# Altium footprint library Mech.PcbLib: 75 footprints (part 2 of 5)
Each footprint in its own frame and in the unit in brackets; x right, y up, seen from the top. Pads: shape width x height; smd on the part's side, far side on the other; paste and mask are expansions set on the pad; w line width, h text height; cw(c..) or ccw(c..) is an arc to the next point about the centre after c.
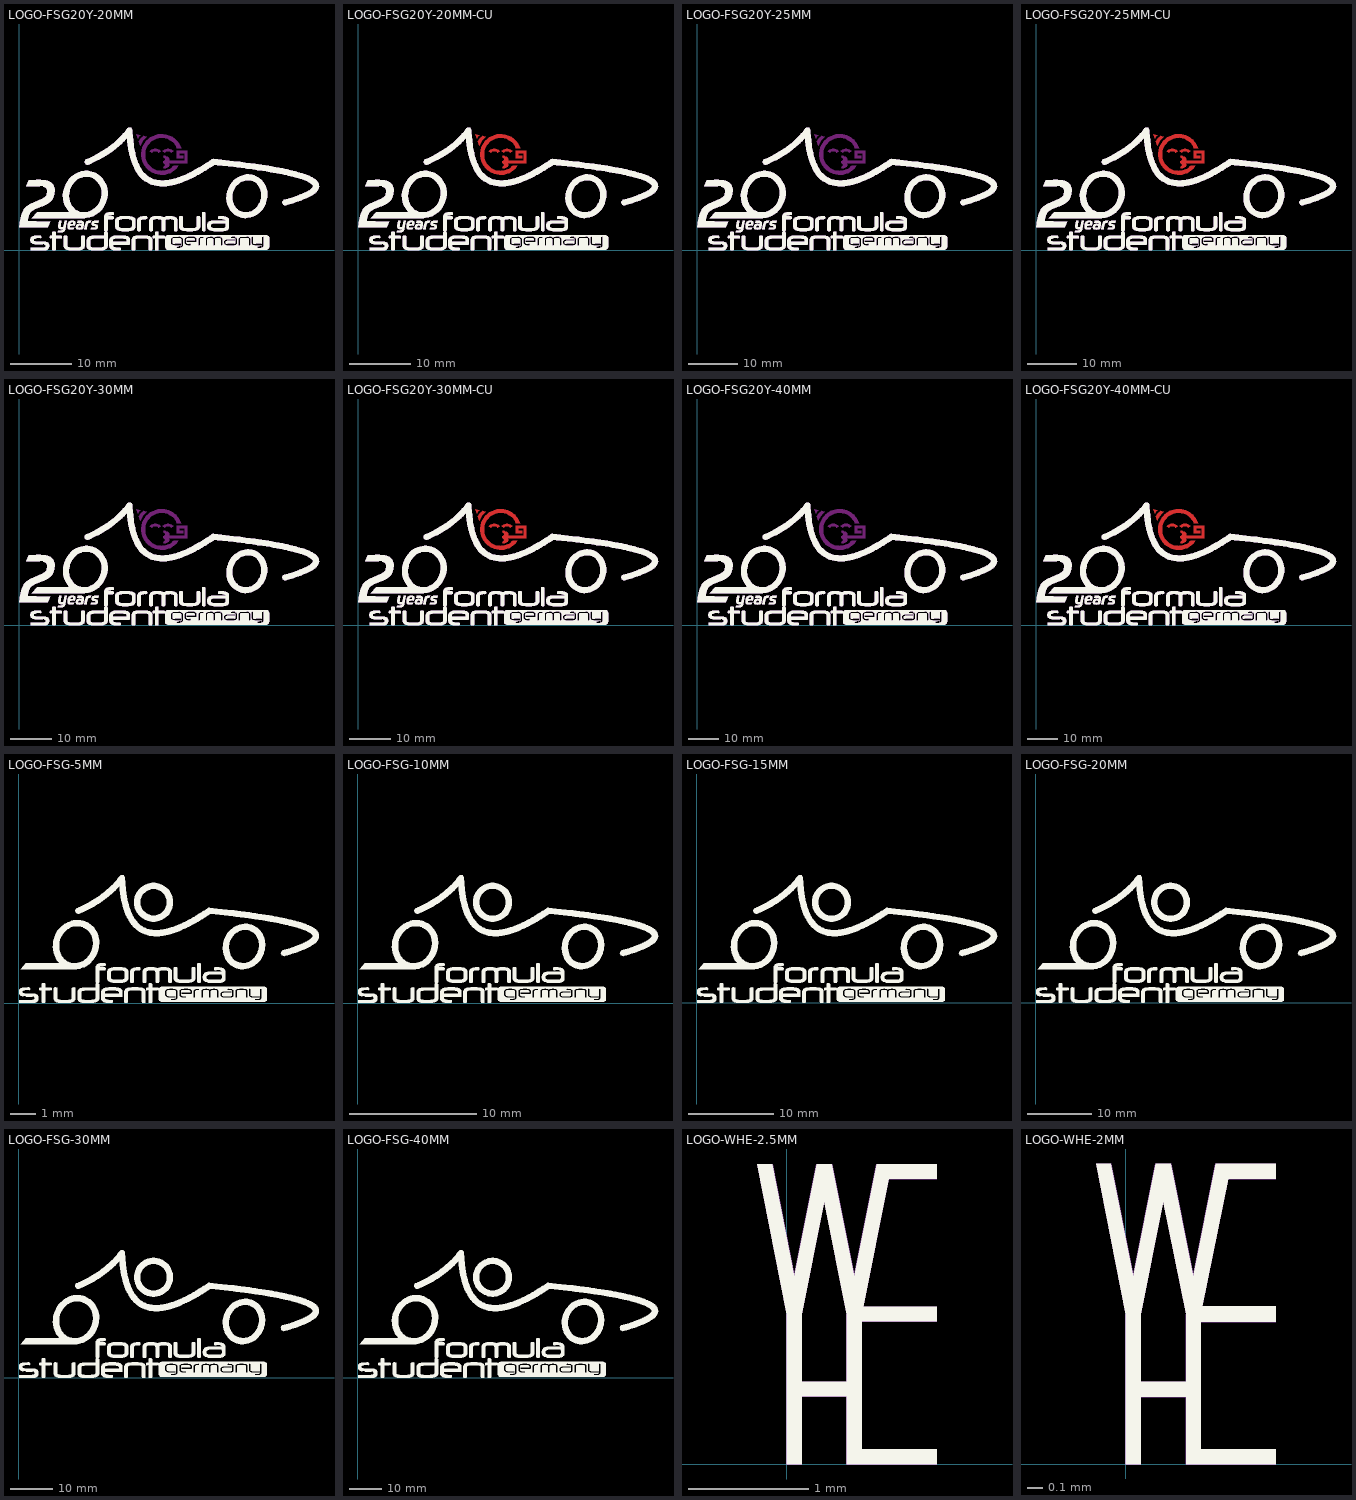
[diagram p1: the footprints below, top view; thin cyan lines are the x and y axes]

## LOGO-FSG20Y-20MM [mm] "Source: https://www.formulastudent.de/pr/logos /  / Terms of use / Nutzungsbedingungen /  / \"Formula Student\" is registered trademark. The FSG logos are also subject to international copyright laws.  /  / EN: The right to use the FSG logo in an appropriate context is reserved to the teams, to the sponsors of the FSG event and to the press reporting on FSG. Other parties including the teams' sponsors are not allowed to use the FSG logo for any purpose. /  / DE: Teams, Sponsoren des FSG-Wettbewerb und Presse, die über die FSG berichtet, dürfen das FSG-Logo im entsprechenden Kontext frei verwenden. Anderen, die Sponsoren der Teams eingeschlossen, ist die Verwendung des FSG-Logos nicht gestattet."
Top Layer keep-out:
  region: 412 vertices and 0 holes, not listed, extent 23.472,13.335 27.364,16.243
  region: 23.36,16.11 23.691,15.86 23.694,15.86 23.746,15.922 23.871,16.026 24.016,16.099 24.173,16.136 24.335,16.136 24.493,16.099 24.638,16.026 24.762,15.922 24.814,15.86 25.145,16.11 25.068,16.214 24.868,16.381 24.636,16.498 24.383,16.557 24.123,16.557 23.87,16.498 23.637,16.381 23.438,16.214
  region: 21.285,16.11 21.616,15.86 21.619,15.86 21.671,15.922 21.796,16.026 21.94,16.099 22.098,16.136 22.26,16.136 22.418,16.099 22.563,16.026 22.687,15.922 22.739,15.86 23.07,16.11 22.992,16.214 22.793,16.381 22.561,16.498 22.308,16.557 22.048,16.557 21.795,16.498 21.562,16.381 21.363,16.214
  region: 20.518,15.616 20.523,15.44 20.569,15.09 20.661,14.748 20.796,14.422 20.972,14.116 21.187,13.836 21.437,13.586 21.717,13.372 22.023,13.195 22.349,13.06 22.69,12.969 23.04,12.923 23.217,12.917 23.214,12.923 23.35,12.926 23.62,12.953 23.887,13.008 24.146,13.089 24.396,13.195 24.634,13.326 24.858,13.481 25.065,13.657 25.162,13.753 25.962,13.753 25.848,13.585 25.582,13.281 25.28,13.011 24.949,12.78 24.591,12.59 24.213,12.446 23.821,12.348 23.419,12.299 23.217,12.299 22.999,12.299 22.568,12.356 22.147,12.468 21.745,12.635 21.368,12.852 21.023,13.117 20.715,13.425 20.45,13.77 20.233,14.147 20.066,14.549 19.953,14.97 19.897,15.401 19.897,15.619 19.897,15.837 19.953,16.268 20.066,16.688 20.233,17.091 20.45,17.467 20.715,17.813 21.023,18.12 21.368,18.385 21.745,18.603 22.147,18.77 22.568,18.882 22.999,18.939 23.217,18.939 23.477,18.939 23.992,18.857 24.489,18.697 24.954,18.461 25.376,18.155 25.746,17.787 26.054,17.366 26.292,16.903 26.374,16.655 25.71,16.655 25.627,16.835 25.422,17.175 25.17,17.481 24.876,17.747 24.546,17.967 24.187,18.136 23.807,18.25 23.415,18.308 23.217,18.315 23.04,18.309 22.69,18.263 22.349,18.172 22.023,18.037 21.717,17.86 21.437,17.645 21.188,17.396 20.973,17.116 20.796,16.81 20.661,16.484 20.57,16.143 20.523,15.793
  region: 19.766,17.065 19.517,17.729 19.588,17.854 19.746,18.092 19.92,18.32 20.109,18.535 20.211,18.635 20.805,18.478 20.641,18.33 20.339,18.006 20.077,17.65 19.859,17.266
  region: 19.064,18.942 19.755,18.757 19.699,18.694 19.589,18.563 19.484,18.429 19.383,18.291 19.335,18.22
Top Overlay:
  drawing of 25 lines, arcs and shapes, not listed
Top Solder:
  drawing of 6 lines, arcs and shapes, not listed
Top Assembly:
  drawing of 25 lines, arcs and shapes, not listed

## LOGO-FSG20Y-20MM-CU [mm] "Source: https://www.formulastudent.de/pr/logos /  / Terms of use / Nutzungsbedingungen /  / \"Formula Student\" is registered trademark. The FSG logos are also subject to international copyright laws.  /  / EN: The right to use the FSG logo in an appropriate context is reserved to the teams, to the sponsors of the FSG event and to the press reporting on FSG. Other parties including the teams' sponsors are not allowed to use the FSG logo for any purpose. /  / DE: Teams, Sponsoren des FSG-Wettbewerb und Presse, die über die FSG berichtet, dürfen das FSG-Logo im entsprechenden Kontext frei verwenden. Anderen, die Sponsoren der Teams eingeschlossen, ist die Verwendung des FSG-Logos nicht gestattet."
Top Layer:
  region: 412 vertices and 0 holes, not listed, extent 23.472,13.335 27.364,16.243
  region: 23.36,16.11 23.691,15.86 23.694,15.86 23.746,15.922 23.871,16.026 24.016,16.099 24.173,16.136 24.335,16.136 24.493,16.099 24.638,16.026 24.762,15.922 24.814,15.86 25.145,16.11 25.068,16.214 24.868,16.381 24.636,16.498 24.383,16.557 24.123,16.557 23.87,16.498 23.637,16.381 23.438,16.214
  region: 21.285,16.11 21.616,15.86 21.619,15.86 21.671,15.922 21.796,16.026 21.94,16.099 22.098,16.136 22.26,16.136 22.418,16.099 22.563,16.026 22.687,15.922 22.739,15.86 23.07,16.11 22.992,16.214 22.793,16.381 22.561,16.498 22.308,16.557 22.048,16.557 21.795,16.498 21.562,16.381 21.363,16.214
  region: 20.518,15.616 20.523,15.44 20.569,15.09 20.661,14.748 20.796,14.422 20.972,14.116 21.187,13.836 21.437,13.586 21.717,13.372 22.023,13.195 22.349,13.06 22.69,12.969 23.04,12.923 23.217,12.917 23.214,12.923 23.35,12.926 23.62,12.953 23.887,13.008 24.146,13.089 24.396,13.195 24.634,13.326 24.858,13.481 25.065,13.657 25.162,13.753 25.962,13.753 25.848,13.585 25.582,13.281 25.28,13.011 24.949,12.78 24.591,12.59 24.213,12.446 23.821,12.348 23.419,12.299 23.217,12.299 22.999,12.299 22.568,12.356 22.147,12.468 21.745,12.635 21.368,12.852 21.023,13.117 20.715,13.425 20.45,13.77 20.233,14.147 20.066,14.549 19.953,14.97 19.897,15.401 19.897,15.619 19.897,15.837 19.953,16.268 20.066,16.688 20.233,17.091 20.45,17.467 20.715,17.813 21.023,18.12 21.368,18.385 21.745,18.603 22.147,18.77 22.568,18.882 22.999,18.939 23.217,18.939 23.477,18.939 23.992,18.857 24.489,18.697 24.954,18.461 25.376,18.155 25.746,17.787 26.054,17.366 26.292,16.903 26.374,16.655 25.71,16.655 25.627,16.835 25.422,17.175 25.17,17.481 24.876,17.747 24.546,17.967 24.187,18.136 23.807,18.25 23.415,18.308 23.217,18.315 23.04,18.309 22.69,18.263 22.349,18.172 22.023,18.037 21.717,17.86 21.437,17.645 21.188,17.396 20.973,17.116 20.796,16.81 20.661,16.484 20.57,16.143 20.523,15.793
  region: 19.766,17.065 19.517,17.729 19.588,17.854 19.746,18.092 19.92,18.32 20.109,18.535 20.211,18.635 20.805,18.478 20.641,18.33 20.339,18.006 20.077,17.65 19.859,17.266
  region: 19.064,18.942 19.755,18.757 19.699,18.694 19.589,18.563 19.484,18.429 19.383,18.291 19.335,18.22
Top Overlay:
  drawing of 25 lines, arcs and shapes, not listed
Top Solder:
  drawing of 6 lines, arcs and shapes, not listed
Top Assembly:
  drawing of 25 lines, arcs and shapes, not listed

## LOGO-FSG20Y-25MM [mm] "Source: https://www.formulastudent.de/pr/logos /  / Terms of use / Nutzungsbedingungen /  / \"Formula Student\" is registered trademark. The FSG logos are also subject to international copyright laws.  /  / EN: The right to use the FSG logo in an appropriate context is reserved to the teams, to the sponsors of the FSG event and to the press reporting on FSG. Other parties including the teams' sponsors are not allowed to use the FSG logo for any purpose. /  / DE: Teams, Sponsoren des FSG-Wettbewerb und Presse, die über die FSG berichtet, dürfen das FSG-Logo im entsprechenden Kontext frei verwenden. Anderen, die Sponsoren der Teams eingeschlossen, ist die Verwendung des FSG-Logos nicht gestattet."
Top Layer keep-out:
  region: 23.828,23.679 24.692,23.449 24.621,23.369 24.484,23.206 24.353,23.038 24.227,22.866 24.167,22.778
  region: 24.706,21.333 24.394,22.164 24.483,22.32 24.68,22.618 24.898,22.902 25.135,23.17 25.262,23.296 26.004,23.1 25.799,22.915 25.422,22.51 25.095,22.065 24.821,21.585
  region: 25.645,19.523 25.652,19.302 25.71,18.865 25.824,18.438 25.992,18.03 26.213,17.648 26.482,17.298 26.794,16.986 27.144,16.717 27.526,16.497 27.934,16.328 28.36,16.214 28.798,16.156 29.019,16.149 29.015,16.156 29.185,16.16 29.523,16.195 29.856,16.262 30.18,16.364 30.493,16.497 30.79,16.661 31.07,16.854 31.329,17.074 31.449,17.194 32.45,17.194 32.308,16.985 31.975,16.604 31.598,16.267 31.183,15.977 30.736,15.741 30.264,15.56 29.773,15.438 29.271,15.376 29.019,15.376 28.747,15.376 28.207,15.447 27.682,15.588 27.179,15.796 26.708,16.068 26.276,16.399 25.892,16.784 25.561,17.216 25.289,17.687 25.08,18.189 24.94,18.715 24.869,19.254 24.869,19.526 24.869,19.798 24.94,20.338 25.08,20.863 25.289,21.366 25.561,21.837 25.892,22.268 26.276,22.653 26.708,22.984 27.179,23.256 27.682,23.464 28.207,23.605 28.747,23.676 29.019,23.676 29.236,23.676 29.667,23.631 30.092,23.54 30.505,23.407 30.901,23.231 31.278,23.014 31.629,22.76 31.953,22.47 32.244,22.148 32.5,21.798 32.719,21.423 32.897,21.027 32.965,20.821 32.134,20.821 32.031,21.047 31.775,21.471 31.46,21.854 31.092,22.186 30.679,22.461 30.231,22.672 29.757,22.815 29.266,22.887 29.019,22.896 28.798,22.889 28.36,22.831 27.934,22.717 27.527,22.548 27.144,22.328 26.794,22.059 26.482,21.747 26.214,21.397 25.993,21.015 25.824,20.607 25.71,20.181 25.652,19.743
  region: 26.605,20.14 27.018,19.828 27.022,19.828 27.087,19.906 27.242,20.036 27.423,20.126 27.62,20.173 27.823,20.173 28.02,20.126 28.201,20.036 28.356,19.906 28.422,19.828 28.835,20.14 28.738,20.27 28.489,20.479 28.199,20.624 27.882,20.699 27.558,20.699 27.241,20.624 26.951,20.479 26.702,20.27
  region: 29.198,20.14 29.612,19.828 29.615,19.828 29.681,19.906 29.836,20.036 30.017,20.126 30.214,20.173 30.417,20.173 30.614,20.126 30.795,20.036 30.95,19.906 31.015,19.828 31.429,20.14 31.332,20.27 31.083,20.479 30.792,20.624 30.476,20.699 30.151,20.699 29.835,20.624 29.545,20.479 29.295,20.27
  region: 414 vertices and 0 holes, not listed, extent 29.337,16.671 34.202,20.306
Top Overlay:
  drawing of 25 lines, arcs and shapes, not listed
Top Solder:
  drawing of 6 lines, arcs and shapes, not listed
Top Assembly:
  drawing of 25 lines, arcs and shapes, not listed

## LOGO-FSG20Y-25MM-CU [mm] "Source: https://www.formulastudent.de/pr/logos /  / Terms of use / Nutzungsbedingungen /  / \"Formula Student\" is registered trademark. The FSG logos are also subject to international copyright laws.  /  / EN: The right to use the FSG logo in an appropriate context is reserved to the teams, to the sponsors of the FSG event and to the press reporting on FSG. Other parties including the teams' sponsors are not allowed to use the FSG logo for any purpose. /  / DE: Teams, Sponsoren des FSG-Wettbewerb und Presse, die über die FSG berichtet, dürfen das FSG-Logo im entsprechenden Kontext frei verwenden. Anderen, die Sponsoren der Teams eingeschlossen, ist die Verwendung des FSG-Logos nicht gestattet."
Top Layer:
  region: 414 vertices and 0 holes, not listed, extent 29.337,16.671 34.202,20.306
  region: 29.198,20.14 29.612,19.828 29.615,19.828 29.681,19.906 29.836,20.036 30.017,20.126 30.214,20.173 30.417,20.173 30.614,20.126 30.795,20.036 30.95,19.906 31.015,19.828 31.429,20.14 31.332,20.27 31.083,20.479 30.792,20.624 30.476,20.699 30.151,20.699 29.835,20.624 29.545,20.479 29.295,20.27
  region: 26.605,20.14 27.018,19.828 27.022,19.828 27.087,19.906 27.242,20.036 27.423,20.126 27.62,20.173 27.823,20.173 28.02,20.126 28.201,20.036 28.356,19.906 28.422,19.828 28.835,20.14 28.738,20.27 28.489,20.479 28.199,20.624 27.882,20.699 27.558,20.699 27.241,20.624 26.951,20.479 26.702,20.27
  region: 25.645,19.523 25.652,19.302 25.71,18.865 25.824,18.438 25.992,18.03 26.213,17.648 26.482,17.298 26.794,16.986 27.144,16.717 27.526,16.497 27.934,16.328 28.36,16.214 28.798,16.156 29.019,16.149 29.015,16.156 29.185,16.16 29.523,16.195 29.856,16.262 30.18,16.364 30.493,16.497 30.79,16.661 31.07,16.854 31.329,17.074 31.449,17.194 32.45,17.194 32.308,16.985 31.975,16.604 31.598,16.267 31.183,15.977 30.736,15.741 30.264,15.56 29.773,15.438 29.271,15.376 29.019,15.376 28.747,15.376 28.207,15.447 27.682,15.588 27.179,15.796 26.708,16.068 26.276,16.399 25.892,16.784 25.561,17.216 25.289,17.687 25.08,18.189 24.94,18.715 24.869,19.254 24.869,19.526 24.869,19.798 24.94,20.338 25.08,20.863 25.289,21.366 25.561,21.837 25.892,22.268 26.276,22.653 26.708,22.984 27.179,23.256 27.682,23.464 28.207,23.605 28.747,23.676 29.019,23.676 29.236,23.676 29.667,23.631 30.092,23.54 30.505,23.407 30.901,23.231 31.278,23.014 31.629,22.76 31.953,22.47 32.244,22.148 32.5,21.798 32.719,21.423 32.897,21.027 32.965,20.821 32.134,20.821 32.031,21.047 31.775,21.471 31.46,21.854 31.092,22.186 30.679,22.461 30.231,22.672 29.757,22.815 29.266,22.887 29.019,22.896 28.798,22.889 28.36,22.831 27.934,22.717 27.527,22.548 27.144,22.328 26.794,22.059 26.482,21.747 26.214,21.397 25.993,21.015 25.824,20.607 25.71,20.181 25.652,19.743
  region: 24.706,21.333 24.394,22.164 24.483,22.32 24.68,22.618 24.898,22.902 25.135,23.17 25.262,23.296 26.004,23.1 25.799,22.915 25.422,22.51 25.095,22.065 24.821,21.585
  region: 23.828,23.679 24.692,23.449 24.621,23.369 24.484,23.206 24.353,23.038 24.227,22.866 24.167,22.778
Top Overlay:
  drawing of 25 lines, arcs and shapes, not listed
Top Solder:
  drawing of 6 lines, arcs and shapes, not listed
Top Assembly:
  drawing of 25 lines, arcs and shapes, not listed

## LOGO-FSG20Y-30MM [mm] "Source: https://www.formulastudent.de/pr/logos /  / Terms of use / Nutzungsbedingungen /  / \"Formula Student\" is registered trademark. The FSG logos are also subject to international copyright laws.  /  / EN: The right to use the FSG logo in an appropriate context is reserved to the teams, to the sponsors of the FSG event and to the press reporting on FSG. Other parties including the teams' sponsors are not allowed to use the FSG logo for any purpose. /  / DE: Teams, Sponsoren des FSG-Wettbewerb und Presse, die über die FSG berichtet, dürfen das FSG-Logo im entsprechenden Kontext frei verwenden. Anderen, die Sponsoren der Teams eingeschlossen, ist die Verwendung des FSG-Logos nicht gestattet."
Top Layer keep-out:
  region: 28.59,28.415 29.627,28.139 29.542,28.043 29.377,27.847 29.22,27.646 29.069,27.439 28.997,27.333
  region: 29.644,25.6 29.269,26.597 29.376,26.784 29.613,27.141 29.874,27.482 30.158,27.805 30.311,27.956 31.202,27.72 30.955,27.498 30.503,27.013 30.11,26.478 29.782,25.902
  region: 30.77,23.428 30.779,23.163 30.848,22.638 30.985,22.127 31.187,21.637 31.452,21.179 31.774,20.758 32.149,20.384 32.569,20.062 33.027,19.797 33.517,19.594 34.028,19.458 34.553,19.389 34.818,19.38 34.814,19.388 35.018,19.393 35.423,19.434 35.823,19.516 36.212,19.637 36.587,19.797 36.944,19.994 37.28,20.225 37.59,20.49 37.735,20.633 38.935,20.633 38.764,20.382 38.365,19.926 37.913,19.521 37.415,19.174 36.879,18.89 36.312,18.673 35.724,18.527 35.121,18.453 34.818,18.453 34.492,18.453 33.845,18.538 33.214,18.707 32.611,18.957 32.046,19.283 31.528,19.68 31.066,20.142 30.669,20.66 30.343,21.225 30.093,21.828 29.924,22.459 29.839,23.106 29.839,23.432 29.839,23.758 29.924,24.405 30.093,25.036 30.343,25.639 30.669,26.204 31.066,26.722 31.528,27.184 32.046,27.581 32.611,27.907 33.214,28.157 33.845,28.326 34.492,28.411 34.818,28.411 35.078,28.411 35.596,28.357 36.106,28.248 36.601,28.088 37.077,27.877 37.529,27.617 37.951,27.312 38.339,26.964 38.688,26.578 38.996,26.158 39.258,25.708 39.472,25.233 39.553,24.986 38.557,24.986 38.432,25.256 38.125,25.766 37.747,26.225 37.306,26.623 36.811,26.953 36.273,27.206 35.704,27.378 35.115,27.465 34.818,27.476 34.553,27.467 34.028,27.398 33.517,27.261 33.028,27.058 32.569,26.793 32.149,26.471 31.775,26.097 31.453,25.677 31.188,25.218 30.985,24.729 30.848,24.218 30.779,23.693
  region: 31.922,24.168 32.418,23.794 32.422,23.794 32.5,23.887 32.687,24.043 32.904,24.152 33.141,24.208 33.384,24.208 33.62,24.152 33.837,24.043 34.024,23.887 34.102,23.794 34.598,24.168 34.482,24.325 34.183,24.575 33.834,24.75 33.455,24.84 33.065,24.84 32.686,24.75 32.337,24.575 32.038,24.325
  region: 35.034,24.168 35.53,23.794 35.534,23.794 35.612,23.887 35.799,24.043 36.016,24.152 36.253,24.208 36.496,24.208 36.732,24.152 36.949,24.043 37.136,23.887 37.214,23.794 37.71,24.168 37.594,24.325 37.295,24.575 36.946,24.75 36.567,24.84 36.177,24.84 35.798,24.75 35.449,24.575 35.15,24.325
  region: 411 vertices and 0 holes, not listed, extent 35.2,20.007 41.038,24.368
Top Overlay:
  drawing of 25 lines, arcs and shapes, not listed
Top Solder:
  drawing of 6 lines, arcs and shapes, not listed
Top Assembly:
  drawing of 25 lines, arcs and shapes, not listed

## LOGO-FSG20Y-30MM-CU [mm] "Source: https://www.formulastudent.de/pr/logos /  / Terms of use / Nutzungsbedingungen /  / \"Formula Student\" is registered trademark. The FSG logos are also subject to international copyright laws.  /  / EN: The right to use the FSG logo in an appropriate context is reserved to the teams, to the sponsors of the FSG event and to the press reporting on FSG. Other parties including the teams' sponsors are not allowed to use the FSG logo for any purpose. /  / DE: Teams, Sponsoren des FSG-Wettbewerb und Presse, die über die FSG berichtet, dürfen das FSG-Logo im entsprechenden Kontext frei verwenden. Anderen, die Sponsoren der Teams eingeschlossen, ist die Verwendung des FSG-Logos nicht gestattet."
Top Layer:
  region: 411 vertices and 0 holes, not listed, extent 35.2,20.007 41.038,24.368
  region: 35.034,24.168 35.53,23.794 35.534,23.794 35.612,23.887 35.799,24.043 36.016,24.152 36.253,24.208 36.496,24.208 36.732,24.152 36.949,24.043 37.136,23.887 37.214,23.794 37.71,24.168 37.594,24.325 37.295,24.575 36.946,24.75 36.567,24.84 36.177,24.84 35.798,24.75 35.449,24.575 35.15,24.325
  region: 31.922,24.168 32.418,23.794 32.422,23.794 32.5,23.887 32.687,24.043 32.904,24.152 33.141,24.208 33.384,24.208 33.62,24.152 33.837,24.043 34.024,23.887 34.102,23.794 34.598,24.168 34.482,24.325 34.183,24.575 33.834,24.75 33.455,24.84 33.065,24.84 32.686,24.75 32.337,24.575 32.038,24.325
  region: 30.77,23.428 30.779,23.163 30.848,22.638 30.985,22.127 31.187,21.637 31.452,21.179 31.774,20.758 32.149,20.384 32.569,20.062 33.027,19.797 33.517,19.594 34.028,19.458 34.553,19.389 34.818,19.38 34.814,19.388 35.018,19.393 35.423,19.434 35.823,19.516 36.212,19.637 36.587,19.797 36.944,19.994 37.28,20.225 37.59,20.49 37.735,20.633 38.935,20.633 38.764,20.382 38.365,19.926 37.913,19.521 37.415,19.174 36.879,18.89 36.312,18.673 35.724,18.527 35.121,18.453 34.818,18.453 34.492,18.453 33.845,18.538 33.214,18.707 32.611,18.957 32.046,19.283 31.528,19.68 31.066,20.142 30.669,20.66 30.343,21.225 30.093,21.828 29.924,22.459 29.839,23.106 29.839,23.432 29.839,23.758 29.924,24.405 30.093,25.036 30.343,25.639 30.669,26.204 31.066,26.722 31.528,27.184 32.046,27.581 32.611,27.907 33.214,28.157 33.845,28.326 34.492,28.411 34.818,28.411 35.078,28.411 35.596,28.357 36.106,28.248 36.601,28.088 37.077,27.877 37.529,27.617 37.951,27.312 38.339,26.964 38.688,26.578 38.996,26.158 39.258,25.708 39.472,25.233 39.553,24.986 38.557,24.986 38.432,25.256 38.125,25.766 37.747,26.225 37.306,26.623 36.811,26.953 36.273,27.206 35.704,27.378 35.115,27.465 34.818,27.476 34.553,27.467 34.028,27.398 33.517,27.261 33.028,27.058 32.569,26.793 32.149,26.471 31.775,26.097 31.453,25.677 31.188,25.218 30.985,24.729 30.848,24.218 30.779,23.693
  region: 29.644,25.6 29.269,26.597 29.376,26.784 29.613,27.141 29.874,27.482 30.158,27.805 30.311,27.956 31.202,27.72 30.955,27.498 30.503,27.013 30.11,26.478 29.782,25.902
  region: 28.59,28.415 29.627,28.139 29.542,28.043 29.377,27.847 29.22,27.646 29.069,27.439 28.997,27.333
Top Overlay:
  drawing of 25 lines, arcs and shapes, not listed
Top Solder:
  drawing of 6 lines, arcs and shapes, not listed
Top Assembly:
  drawing of 25 lines, arcs and shapes, not listed

## LOGO-FSG20Y-40MM [mm] "Source: https://www.formulastudent.de/pr/logos /  / Terms of use / Nutzungsbedingungen /  / \"Formula Student\" is registered trademark. The FSG logos are also subject to international copyright laws.  /  / EN: The right to use the FSG logo in an appropriate context is reserved to the teams, to the sponsors of the FSG event and to the press reporting on FSG. Other parties including the teams' sponsors are not allowed to use the FSG logo for any purpose. /  / DE: Teams, Sponsoren des FSG-Wettbewerb und Presse, die über die FSG berichtet, dürfen das FSG-Logo im entsprechenden Kontext frei verwenden. Anderen, die Sponsoren der Teams eingeschlossen, ist die Verwendung des FSG-Logos nicht gestattet."
Top Layer keep-out:
  region: 408 vertices and 0 holes, not listed, extent 46.929,26.679 54.712,32.493
  region: 46.707,32.227 47.369,31.728 47.374,31.728 47.479,31.852 47.727,32.06 48.017,32.205 48.332,32.28 48.656,32.28 48.971,32.205 49.261,32.06 49.51,31.852 49.614,31.728 50.276,32.227 50.172,32.365 49.925,32.607 49.644,32.808 49.335,32.963 49.006,33.068 48.664,33.122 48.319,33.122 47.977,33.068 47.648,32.963 47.339,32.808 47.058,32.607 46.811,32.365
  region: 42.558,32.227 43.22,31.728 43.225,31.728 43.33,31.852 43.578,32.06 43.868,32.205 44.183,32.28 44.507,32.28 44.823,32.205 45.112,32.06 45.361,31.852 45.465,31.728 46.127,32.227 46.023,32.365 45.776,32.607 45.495,32.808 45.186,32.963 44.857,33.068 44.515,33.122 44.17,33.122 43.828,33.068 43.499,32.963 43.19,32.808 42.909,32.607 42.662,32.365
  region: 41.023,31.24 41.035,30.887 41.126,30.187 41.309,29.505 41.579,28.852 41.932,28.241 42.361,27.681 42.861,27.182 43.421,26.752 44.032,26.399 44.685,26.129 45.367,25.947 46.067,25.855 46.42,25.843 46.414,25.854 46.686,25.861 47.227,25.916 47.759,26.024 48.278,26.186 48.778,26.399 49.254,26.661 49.701,26.97 50.115,27.323 50.308,27.514 51.908,27.514 51.681,27.179 51.148,26.57 50.546,26.031 49.882,25.568 49.167,25.19 48.412,24.901 47.627,24.705 46.824,24.607 46.42,24.607 46.094,24.607 45.444,24.671 44.805,24.798 44.181,24.987 43.578,25.237 43.003,25.544 42.46,25.907 41.956,26.321 41.495,26.782 41.081,27.286 40.719,27.828 40.411,28.404 40.162,29.006 39.973,29.63 39.845,30.27 39.781,30.919 39.781,31.245 39.781,31.571 39.845,32.22 39.973,32.86 40.162,33.484 40.411,34.087 40.719,34.662 41.081,35.204 41.495,35.709 41.956,36.17 42.46,36.584 43.003,36.946 43.578,37.253 44.181,37.503 44.805,37.692 45.444,37.82 46.094,37.884 46.42,37.884 46.767,37.883 47.457,37.811 48.137,37.667 48.797,37.453 49.432,37.171 50.033,36.825 50.596,36.418 51.113,35.955 51.579,35.44 51.989,34.88 52.339,34.28 52.624,33.647 52.733,33.317 51.404,33.317 51.296,33.559 51.046,34.024 50.751,34.463 50.415,34.872 50.04,35.245 49.631,35.58 49.191,35.873 48.724,36.121 48.235,36.323 47.729,36.476 47.21,36.579 46.684,36.63 46.42,36.636 46.067,36.625 45.367,36.532 44.685,36.35 44.033,36.08 43.422,35.727 42.862,35.297 42.363,34.798 41.933,34.238 41.58,33.627 41.31,32.974 41.127,32.293 41.035,31.593
  region: 39.521,34.136 39.022,35.465 39.164,35.714 39.48,36.191 39.828,36.645 40.207,37.075 40.41,37.276 41.598,36.962 41.432,36.816 41.112,36.511 40.81,36.187 40.528,35.847 40.266,35.49 40.025,35.119 39.806,34.735 39.61,34.338
  region: 38.116,37.889 39.499,37.52 39.386,37.393 39.166,37.132 38.956,36.863 38.755,36.587 38.659,36.446
Top Overlay:
  drawing of 25 lines, arcs and shapes, not listed
Top Solder:
  drawing of 6 lines, arcs and shapes, not listed
Top Assembly:
  drawing of 25 lines, arcs and shapes, not listed

## LOGO-FSG20Y-40MM-CU [mm]
Top Layer:
  region: 38.116,37.889 39.499,37.52 39.386,37.393 39.166,37.132 38.956,36.863 38.755,36.587 38.659,36.446
  region: 39.521,34.136 39.022,35.465 39.164,35.714 39.48,36.191 39.828,36.645 40.207,37.075 40.41,37.276 41.598,36.962 41.432,36.816 41.112,36.511 40.81,36.187 40.528,35.847 40.266,35.49 40.025,35.119 39.806,34.735 39.61,34.338
  region: 41.023,31.24 41.035,30.887 41.126,30.187 41.309,29.505 41.579,28.852 41.932,28.241 42.361,27.681 42.861,27.182 43.421,26.752 44.032,26.399 44.685,26.129 45.367,25.947 46.067,25.855 46.42,25.843 46.414,25.854 46.686,25.861 47.227,25.916 47.759,26.024 48.278,26.186 48.778,26.399 49.254,26.661 49.701,26.97 50.115,27.323 50.308,27.514 51.908,27.514 51.681,27.179 51.148,26.57 50.546,26.031 49.882,25.568 49.167,25.19 48.412,24.901 47.627,24.705 46.824,24.607 46.42,24.607 46.094,24.607 45.444,24.671 44.805,24.798 44.181,24.987 43.578,25.237 43.003,25.544 42.46,25.907 41.956,26.321 41.495,26.782 41.081,27.286 40.719,27.828 40.411,28.404 40.162,29.006 39.973,29.63 39.845,30.27 39.781,30.919 39.781,31.245 39.781,31.571 39.845,32.22 39.973,32.86 40.162,33.484 40.411,34.087 40.719,34.662 41.081,35.204 41.495,35.709 41.956,36.17 42.46,36.584 43.003,36.946 43.578,37.253 44.181,37.503 44.805,37.692 45.444,37.82 46.094,37.884 46.42,37.884 46.767,37.883 47.457,37.811 48.137,37.667 48.797,37.453 49.432,37.171 50.033,36.825 50.596,36.418 51.113,35.955 51.579,35.44 51.989,34.88 52.339,34.28 52.624,33.647 52.733,33.317 51.404,33.317 51.296,33.559 51.046,34.024 50.751,34.463 50.415,34.872 50.04,35.245 49.631,35.58 49.191,35.873 48.724,36.121 48.235,36.323 47.729,36.476 47.21,36.579 46.684,36.63 46.42,36.636 46.067,36.625 45.367,36.532 44.685,36.35 44.033,36.08 43.422,35.727 42.862,35.297 42.363,34.798 41.933,34.238 41.58,33.627 41.31,32.974 41.127,32.293 41.035,31.593
  region: 42.558,32.227 43.22,31.728 43.225,31.728 43.33,31.852 43.578,32.06 43.868,32.205 44.183,32.28 44.507,32.28 44.823,32.205 45.112,32.06 45.361,31.852 45.465,31.728 46.127,32.227 46.023,32.365 45.776,32.607 45.495,32.808 45.186,32.963 44.857,33.068 44.515,33.122 44.17,33.122 43.828,33.068 43.499,32.963 43.19,32.808 42.909,32.607 42.662,32.365
  region: 46.707,32.227 47.369,31.728 47.374,31.728 47.479,31.852 47.727,32.06 48.017,32.205 48.332,32.28 48.656,32.28 48.971,32.205 49.261,32.06 49.51,31.852 49.614,31.728 50.276,32.227 50.172,32.365 49.925,32.607 49.644,32.808 49.335,32.963 49.006,33.068 48.664,33.122 48.319,33.122 47.977,33.068 47.648,32.963 47.339,32.808 47.058,32.607 46.811,32.365
  region: 408 vertices and 0 holes, not listed, extent 46.929,26.679 54.712,32.493
Top Overlay:
  drawing of 25 lines, arcs and shapes, not listed
Top Solder:
  drawing of 6 lines, arcs and shapes, not listed
Top Assembly:
  drawing of 25 lines, arcs and shapes, not listed

## LOGO-FSG-5MM [mm] "Source: https://www.formulastudent.de/pr/logos /  / Terms of use / Nutzungsbedingungen /  / \"Formula Student\" is registered trademark. The FSG logos are also subject to international copyright laws.  /  / EN: The right to use the FSG logo in an appropriate context is reserved to the teams, to the sponsors of the FSG event and to the press reporting on FSG. Other parties including the teams' sponsors are not allowed to use the FSG logo for any purpose. /  / DE: Teams, Sponsoren des FSG-Wettbewerb und Presse, die über die FSG berichtet, dürfen das FSG-Logo im entsprechenden Kontext frei verwenden. Anderen, die Sponsoren der Teams eingeschlossen, ist die Verwendung des FSG-Logos nicht gestattet."
Top Overlay:
  drawing of 20 lines, arcs and shapes, not listed
3D body: height 0.05, standoff 0, extent 0.006,0.008 0.765,0.609
3D body: height 0.05, standoff 0, extent 0.797,0.008 1.284,0.771
3D body: height 0.05, standoff 0, extent 0.069,1.322 2.201,1.552
3D body: height 0.05, standoff 0, extent 1.366,0.006 2.205,0.609
3D body: height 0.05, standoff 0, extent 1.331,1.321 3.142,3.241
3D body: height 0.05, standoff 0, extent 2.292,0.008 3.134,0.769
3D body: height 0.05, standoff 0, extent 3.003,0.795 3.385,1.558
3D body: height 0.05, standoff 0, extent 3.212,0.008 4.041,0.609
3D body: height 0.05, standoff 0, extent 3.447,0.795 4.266,1.394
3D body: height 0.05, standoff 0, extent 4.122,0.008 4.94,0.609
3D body: height 0.05, standoff 0, extent 4.346,0.795 4.737,1.394
3D body: height 0.05, standoff 0, extent 4.97,0.008 5.459,0.771
3D body: height 0.05, standoff 0, extent 4.504,3.181 6.013,4.69
3D body: height 0.05, standoff 0, extent 4.837,0.795 5.971,1.394
3D body: height 0.05, standoff 0, extent 6.051,0.794 6.89,1.394
3D body: height 0.05, standoff 0, extent 2.205,1.836 11.716,4.997
3D body: height 0.05, standoff 0, extent 6.971,0.795 7.103,1.558
3D body: height 0.05, standoff 0, extent 5.466,0.047 9.685,0.632
3D body: height 0.05, standoff 0, extent 7.188,0.795 8.063,1.394
3D body: height 0.05, standoff 0, extent 7.962,1.323 9.615,3.095

## LOGO-FSG-10MM [mm] "Source: https://www.formulastudent.de/pr/logos /  / Terms of use / Nutzungsbedingungen /  / \"Formula Student\" is registered trademark. The FSG logos are also subject to international copyright laws.  /  / EN: The right to use the FSG logo in an appropriate context is reserved to the teams, to the sponsors of the FSG event and to the press reporting on FSG. Other parties including the teams' sponsors are not allowed to use the FSG logo for any purpose. /  / DE: Teams, Sponsoren des FSG-Wettbewerb und Presse, die über die FSG berichtet, dürfen das FSG-Logo im entsprechenden Kontext frei verwenden. Anderen, die Sponsoren der Teams eingeschlossen, ist die Verwendung des FSG-Logos nicht gestattet."
Top Overlay:
  drawing of 20 lines, arcs and shapes, not listed
3D body: height 0.05, standoff 0, extent 0.006,0.01 1.527,1.214
3D body: height 0.05, standoff 0, extent 1.591,0.01 2.567,1.538
3D body: height 0.05, standoff 0, extent 0.131,2.644 4.405,3.103
3D body: height 0.05, standoff 0, extent 2.731,0.006 4.413,1.214
3D body: height 0.05, standoff 0, extent 2.661,2.641 6.278,6.489
3D body: height 0.05, standoff 0, extent 4.588,0.01 6.275,1.534
3D body: height 0.05, standoff 0, extent 6.011,1.588 6.777,3.116
3D body: height 0.05, standoff 0, extent 6.431,0.01 8.091,1.214
3D body: height 0.05, standoff 0, extent 6.901,1.588 8.544,2.788
3D body: height 0.05, standoff 0, extent 8.255,0.01 9.893,1.214
3D body: height 0.05, standoff 0, extent 8.704,1.588 9.487,2.788
3D body: height 0.05, standoff 0, extent 9.954,0.01 10.933,1.538
3D body: height 0.05, standoff 0, extent 9.021,6.369 12.044,9.393
3D body: height 0.05, standoff 0, extent 9.686,1.588 11.959,2.788
3D body: height 0.05, standoff 0, extent 12.119,1.584 13.801,2.788
3D body: height 0.05, standoff 0, extent 4.413,3.673 23.474,10.008
3D body: height 0.05, standoff 0, extent 13.964,1.588 14.228,3.116
3D body: height 0.05, standoff 0, extent 10.948,0.088 19.403,1.26
3D body: height 0.05, standoff 0, extent 14.399,1.588 16.151,2.788
3D body: height 0.05, standoff 0, extent 15.951,2.646 19.262,6.196

## LOGO-FSG-15MM [mm] "Source: https://www.formulastudent.de/pr/logos /  / Terms of use / Nutzungsbedingungen /  / \"Formula Student\" is registered trademark. The FSG logos are also subject to international copyright laws.  /  / EN: The right to use the FSG logo in an appropriate context is reserved to the teams, to the sponsors of the FSG event and to the press reporting on FSG. Other parties including the teams' sponsors are not allowed to use the FSG logo for any purpose. /  / DE: Teams, Sponsoren des FSG-Wettbewerb und Presse, die über die FSG berichtet, dürfen das FSG-Logo im entsprechenden Kontext frei verwenden. Anderen, die Sponsoren der Teams eingeschlossen, ist die Verwendung des FSG-Logos nicht gestattet."
Top Overlay:
  drawing of 20 lines, arcs and shapes, not listed
3D body: height 0.05, standoff 0, extent 0.006,0.012 2.286,1.816
3D body: height 0.05, standoff 0, extent 2.382,0.012 3.845,2.302
3D body: height 0.05, standoff 0, extent 0.193,3.959 6.599,4.648
3D body: height 0.05, standoff 0, extent 4.09,0.006 6.611,1.816
3D body: height 0.05, standoff 0, extent 3.986,3.956 9.406,9.723
3D body: height 0.05, standoff 0, extent 6.873,0.011 9.402,2.296
3D body: height 0.05, standoff 0, extent 9.006,2.377 10.154,4.667
3D body: height 0.05, standoff 0, extent 9.636,0.012 12.124,1.816
3D body: height 0.05, standoff 0, extent 10.34,2.377 12.802,4.176
3D body: height 0.05, standoff 0, extent 12.369,0.011 14.825,1.816
3D body: height 0.05, standoff 0, extent 13.042,2.376 14.217,4.176
3D body: height 0.05, standoff 0, extent 14.916,0.012 16.384,2.302
3D body: height 0.05, standoff 0, extent 13.517,9.543 18.049,14.075
3D body: height 0.05, standoff 0, extent 14.515,2.376 17.921,4.176
3D body: height 0.05, standoff 0, extent 18.161,2.371 20.682,4.176
3D body: height 0.05, standoff 0, extent 6.611,5.502 35.18,14.996
3D body: height 0.05, standoff 0, extent 20.926,2.376 21.322,4.667
3D body: height 0.05, standoff 0, extent 16.405,0.129 29.079,1.886
3D body: height 0.05, standoff 0, extent 21.578,2.376 24.205,4.175
3D body: height 0.05, standoff 0, extent 23.904,3.963 28.867,9.284

## LOGO-FSG-20MM [mm] "Source: https://www.formulastudent.de/pr/logos /  / Terms of use / Nutzungsbedingungen /  / \"Formula Student\" is registered trademark. The FSG logos are also subject to international copyright laws.  /  / EN: The right to use the FSG logo in an appropriate context is reserved to the teams, to the sponsors of the FSG event and to the press reporting on FSG. Other parties including the teams' sponsors are not allowed to use the FSG logo for any purpose. /  / DE: Teams, Sponsoren des FSG-Wettbewerb und Presse, die über die FSG berichtet, dürfen das FSG-Logo im entsprechenden Kontext frei verwenden. Anderen, die Sponsoren der Teams eingeschlossen, ist die Verwendung des FSG-Logos nicht gestattet."
Top Overlay:
  drawing of 20 lines, arcs and shapes, not listed
3D body: height 0.05, standoff 0, extent 31.892,5.285 38.513,12.385
3D body: height 0.05, standoff 0, extent 28.788,3.169 32.292,5.569
3D body: height 0.05, standoff 0, extent 21.886,0.17 38.796,2.514
3D body: height 0.05, standoff 0, extent 27.919,3.169 28.446,6.224
3D body: height 0.05, standoff 0, extent 8.819,7.339 46.936,20.007
3D body: height 0.05, standoff 0, extent 24.229,3.162 27.593,5.569
3D body: height 0.05, standoff 0, extent 19.364,3.169 23.909,5.57
3D body: height 0.05, standoff 0, extent 18.033,12.731 24.08,18.777
3D body: height 0.05, standoff 0, extent 19.899,0.013 21.858,3.069
3D body: height 0.05, standoff 0, extent 17.399,3.169 18.966,5.569
3D body: height 0.05, standoff 0, extent 16.501,0.013 19.778,2.421
3D body: height 0.05, standoff 0, extent 13.794,3.169 17.079,5.569
3D body: height 0.05, standoff 0, extent 12.855,0.013 16.174,2.421
3D body: height 0.05, standoff 0, extent 12.015,3.169 13.546,6.225
3D body: height 0.05, standoff 0, extent 9.168,0.013 12.543,3.062
3D body: height 0.05, standoff 0, extent 5.316,5.276 12.548,12.971
3D body: height 0.05, standoff 0, extent 5.455,0.006 8.818,2.421
3D body: height 0.05, standoff 0, extent 0.256,5.281 8.803,6.2
3D body: height 0.05, standoff 0, extent 3.176,0.014 5.128,3.069
3D body: height 0.05, standoff 0, extent 0.006,0.013 3.048,2.421

## LOGO-FSG-30MM [mm] "Source: https://www.formulastudent.de/pr/logos /  / Terms of use / Nutzungsbedingungen /  / \"Formula Student\" is registered trademark. The FSG logos are also subject to international copyright laws.  /  / EN: The right to use the FSG logo in an appropriate context is reserved to the teams, to the sponsors of the FSG event and to the press reporting on FSG. Other parties including the teams' sponsors are not allowed to use the FSG logo for any purpose. /  / DE: Teams, Sponsoren des FSG-Wettbewerb und Presse, die über die FSG berichtet, dürfen das FSG-Logo im entsprechenden Kontext frei verwenden. Anderen, die Sponsoren der Teams eingeschlossen, ist die Verwendung des FSG-Logos nicht gestattet."
Top Overlay:
  drawing of 20 lines, arcs and shapes, not listed
3D body: height 0.05, standoff 0, extent 47.846,7.924 57.752,18.574
3D body: height 0.05, standoff 0, extent 43.177,4.749 48.434,8.35
3D body: height 0.05, standoff 0, extent 32.826,0.252 58.188,3.767
3D body: height 0.05, standoff 0, extent 41.874,4.75 42.665,9.333
3D body: height 0.05, standoff 0, extent 13.225,11.013 70.398,30.003
3D body: height 0.05, standoff 0, extent 36.34,4.739 41.385,8.35
3D body: height 0.05, standoff 0, extent 29.043,4.75 35.86,8.351
3D body: height 0.05, standoff 0, extent 27.045,19.092 36.116,28.162
3D body: height 0.05, standoff 0, extent 29.845,0.017 32.783,4.601
3D body: height 0.05, standoff 0, extent 26.095,4.75 28.445,8.35
3D body: height 0.05, standoff 0, extent 24.748,0.017 29.664,3.628
3D body: height 0.05, standoff 0, extent 20.688,4.75 25.614,8.351
3D body: height 0.05, standoff 0, extent 19.279,0.017 24.258,3.628
3D body: height 0.05, standoff 0, extent 18.018,4.75 20.315,9.333
3D body: height 0.05, standoff 0, extent 13.749,0.016 18.81,4.59
3D body: height 0.05, standoff 0, extent 7.97,7.911 18.806,19.452
3D body: height 0.05, standoff 0, extent 8.179,0.006 13.224,3.628
3D body: height 0.05, standoff 0, extent 0.38,7.918 13.201,9.296
3D body: height 0.05, standoff 0, extent 4.761,0.017 7.688,4.6
3D body: height 0.05, standoff 0, extent 0.006,0.017 4.569,3.628

## LOGO-FSG-40MM [mm] "Source: https://www.formulastudent.de/pr/logos /  / Terms of use / Nutzungsbedingungen /  / \"Formula Student\" is registered trademark. The FSG logos are also subject to international copyright laws.  /  / EN: The right to use the FSG logo in an appropriate context is reserved to the teams, to the sponsors of the FSG event and to the press reporting on FSG. Other parties including the teams' sponsors are not allowed to use the FSG logo for any purpose. /  / DE: Teams, Sponsoren des FSG-Wettbewerb und Presse, die über die FSG berichtet, dürfen das FSG-Logo im entsprechenden Kontext frei verwenden. Anderen, die Sponsoren der Teams eingeschlossen, ist die Verwendung des FSG-Logos nicht gestattet."
Top Overlay:
  drawing of 20 lines, arcs and shapes, not listed
3D body: height 0.05, standoff 0, extent 0.006,0.02 6.091,4.836
3D body: height 0.05, standoff 0, extent 6.347,0.021 10.25,6.133
3D body: height 0.05, standoff 0, extent 0.505,10.557 17.602,12.395
3D body: height 0.05, standoff 0, extent 10.905,0.006 17.632,4.836
3D body: height 0.05, standoff 0, extent 10.632,10.548 25.077,25.932
3D body: height 0.05, standoff 0, extent 18.333,0.02 25.083,6.118
3D body: height 0.05, standoff 0, extent 24.026,6.332 27.09,12.444
3D body: height 0.05, standoff 0, extent 25.707,0.02 32.347,4.836
3D body: height 0.05, standoff 0, extent 27.586,6.332 34.156,11.134
3D body: height 0.05, standoff 0, extent 33.001,0.02 39.556,4.836
3D body: height 0.05, standoff 0, extent 34.797,6.332 37.932,11.133
3D body: height 0.05, standoff 0, extent 39.798,0.021 43.716,6.133
3D body: height 0.05, standoff 0, extent 36.064,25.459 48.161,37.554
3D body: height 0.05, standoff 0, extent 38.728,6.332 47.819,11.134
3D body: height 0.05, standoff 0, extent 48.459,6.318 55.187,11.133
3D body: height 0.05, standoff 0, extent 17.634,14.684 93.878,40.009
3D body: height 0.05, standoff 0, extent 55.839,6.332 56.894,12.444
3D body: height 0.05, standoff 0, extent 43.773,0.333 77.596,5.021
3D body: height 0.05, standoff 0, extent 57.577,6.332 64.588,11.133
3D body: height 0.05, standoff 0, extent 63.803,10.565 77.014,24.767

## LOGO-WHE-2.5MM [mm]
Top Overlay:
  region: -0.25,2.497 0,1.248 0.125,1.248 0.312,2.185 0.499,1.248 0.499,0.687 0.125,0.687 0.125,1.248 0,1.248 0,0 0.125,0 0.125,0.562 0.499,0.562 0.499,0 1.248,0 1.248,0.125 0.624,0.125 0.624,1.186 1.248,1.186 1.248,1.311 0.637,1.311 0.849,2.372 1.248,2.372 1.248,2.497 0.749,2.497 0.562,1.561 0.375,2.497 0.25,2.497 0.062,1.561 -0.125,2.497
Top Assembly:
  lines w0.006: 0,1.248 -0.25,2.497 -0.125,2.497 0.062,1.561 0.25,2.497 0.375,2.497 0.562,1.561 0.749,2.497 0.874,2.497 1.248,2.497 1.248,2.372 0.849,2.372 0.637,1.311 1.248,1.311 1.248,1.186 0.624,1.186 0.624,0.125 1.248,0.125 1.248,0 0.624,0 0.499,0 0.499,0.562 0.125,0.562 0.125,0 0,0 0,1.248 ; 0,1.248 0.125,1.248 ; 0.125,1.248 0.312,2.185 0.499,1.248 0.499,0.687 0.125,0.687 0.125,1.248

## LOGO-WHE-2MM [mm]
Top Overlay:
  region: -0.2,1.998 0,0.999 0.1,0.999 0.25,1.749 0.4,0.999 0.4,0.55 0.1,0.55 0.1,0.999 0,0.999 0,0 0.1,0 0.1,0.45 0.4,0.45 0.4,0 0.999,0 0.999,0.1 0.5,0.1 0.5,0.949 0.999,0.949 0.999,1.049 0.51,1.049 0.679,1.898 0.999,1.898 0.999,1.998 0.6,1.998 0.45,1.249 0.3,1.998 0.2,1.998 0.05,1.249 -0.1,1.998
Top Assembly:
  lines w0.005: 0,0.999 -0.2,1.998 -0.1,1.998 0.05,1.249 0.2,1.998 0.3,1.998 0.45,1.249 0.6,1.998 0.699,1.998 0.999,1.998 0.999,1.898 0.679,1.898 0.51,1.049 0.999,1.049 0.999,0.949 0.5,0.949 0.5,0.1 0.999,0.1 0.999,0 0.5,0 0.4,0 0.4,0.45 0.1,0.45 0.1,0 0,0 0,0.999 ; 0,0.999 0.1,0.999 ; 0.1,0.999 0.25,1.749 0.4,0.999 0.4,0.55 0.1,0.55 0.1,0.999